# Altium footprint library self_pcblib v1.8.6.PcbLib: 164 footprints (part 2 of 11)
Each footprint in its own frame and in the unit in brackets; x right, y up, seen from the top. Pads: shape width x height; smd on the part's side, far side on the other; paste and mask are expansions set on the pad; w line width, h text height; cw(c..) or ccw(c..) is an arc to the next point about the centre after c.
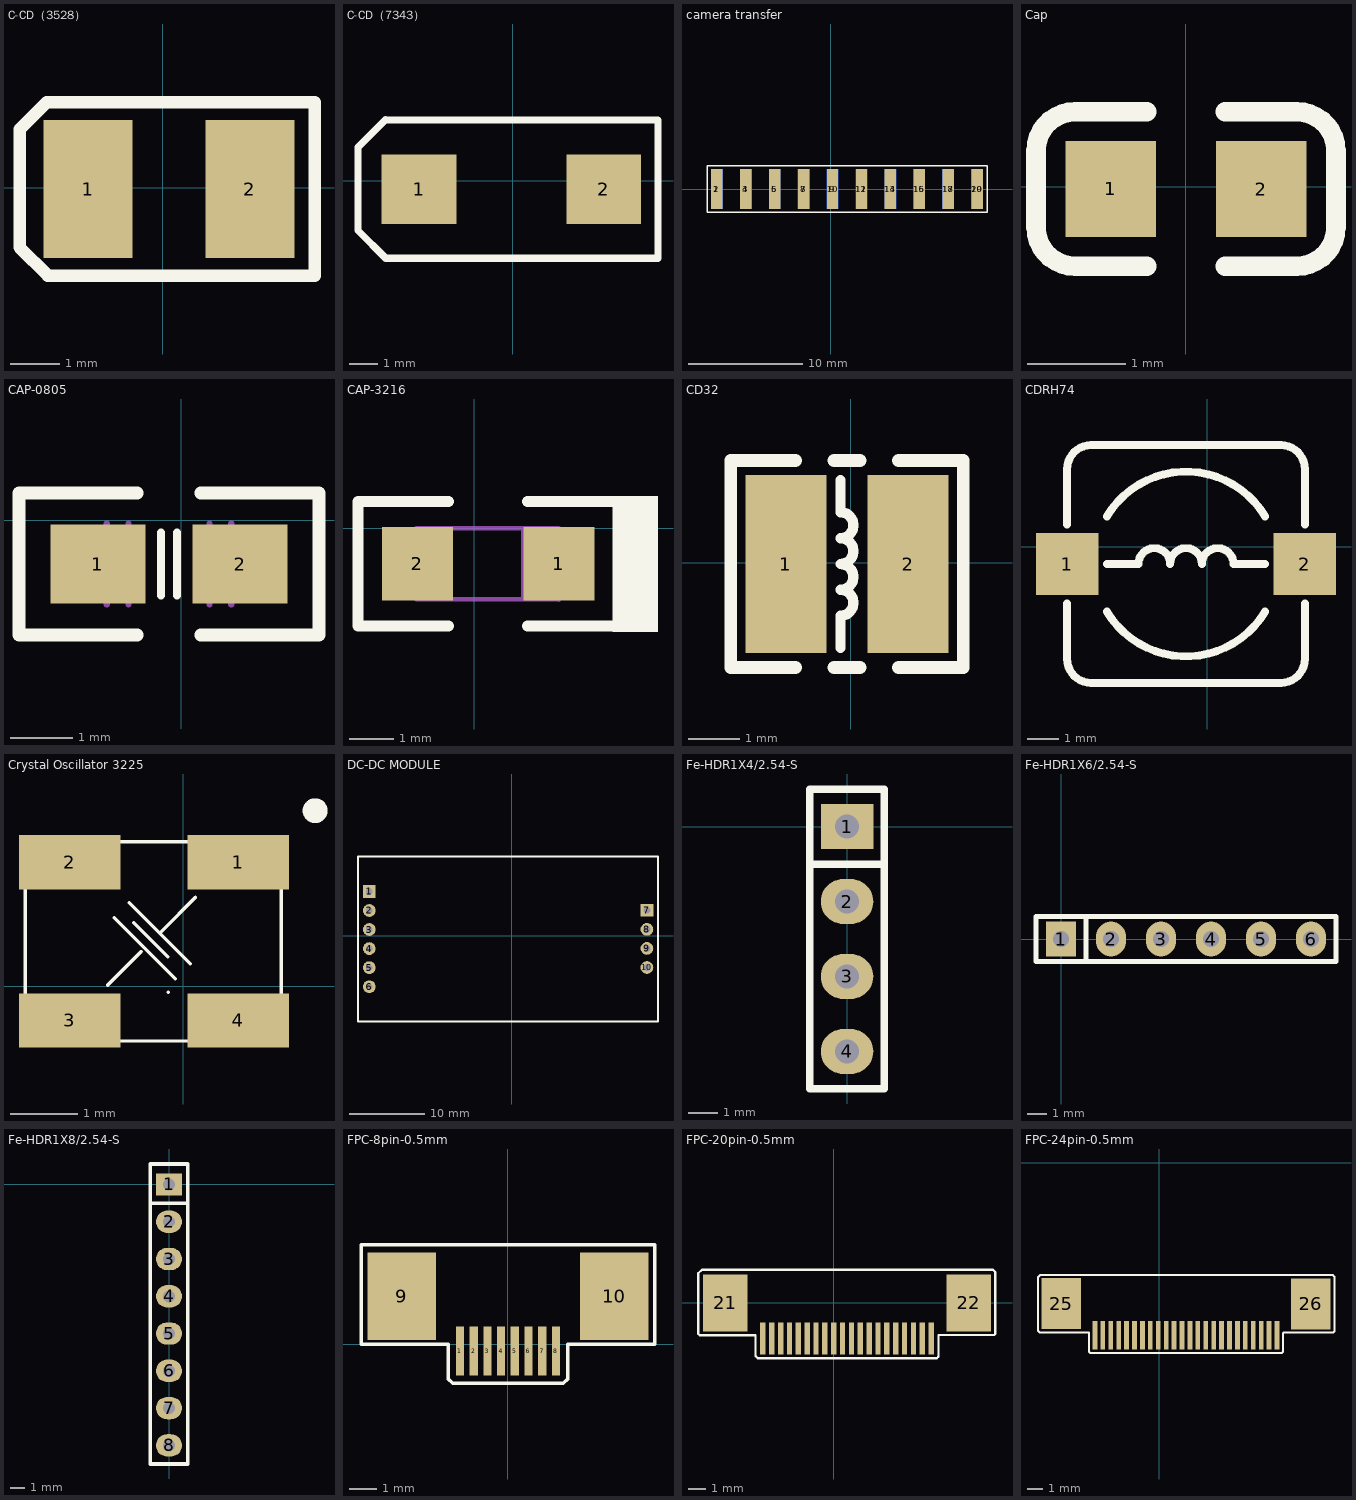
[diagram p1: the footprints below, top view; thin cyan lines are the x and y axes]

## C-CD（3528） [mil] "钽电容"
pads (2):
  rect 70.87x110 smd: 1(-59.5,-1) 2(69.5,-1)
Top Overlay:
  lines w10: -114,-47.5 -91.5,-70 121,-70 121,68 -92.5,68 -114,46.5 -114,-47.5
3D body "TAJ-B.STEP": height 74.8, standoff 0, extent -63.9,-56.11 73.9,54.12

## C-CD（7343） [mm] "钽电容"
pads (2):
  rect 2.6x2.4 smd: 1(-3.253,-0.298) 2(3.147,-0.298)
Top Overlay:
  lines w0.254: -4.42,-2.692 5.029,-2.692 5.029,2.083 ; -4.413,-2.693 -5.376,-1.73 -5.376,1.152 -4.42,2.108 5.029,2.101
3D body "TAJ-D.STEP": height 2.9, standoff 0, extent -3.701,-2.429 3.599,1.871
3D body: height 0.3, standoff 0, extent 3.257,-1.16 3.461,0.61
3D body: height 0.3, standoff 0, extent -3.538,-1.174 -3.442,0.515

## camera transfer [mm]
pads (20):
  rect 1x3.5 smd: 1(-10.008,0) 3(-7.468,0) 5(-4.928,0) 7(-2.388,0) 9(0.152,0) 11(2.692,0) 13(5.232,0) 15(7.772,0) 17(10.312,0) 19(12.852,0)
  rect 1x3.5 smd far side: 2(-10.008,0) 4(-7.468,0) 6(-4.928,0) 8(-2.388,0) 10(0.152,0) 12(2.692,0) 14(5.232,0) 16(7.772,0) 18(10.312,0) 20(12.852,0)
Top Overlay:
  lines w0.127: -10.871,-2.057 13.741,-2.057 13.741,2.057 -10.871,2.057 -10.871,-2.057

## Cap [mm]
pads (2):
  rect 0.93x0.98 smd: 1(-0.77,-0.025) 2(0.77,-0.025)
Top Overlay:
  lines w0.2: -0.4,-0.815 -1.135,-0.815 cw(c-1.135,-0.415) -1.535,-0.415 -1.535,0.365 cw(c-1.135,0.365) -1.135,0.765 -0.4,0.765 ; 0.4,-0.815 1.135,-0.815 ccw(c1.135,-0.415) 1.535,-0.415 1.535,0.365 ccw(c1.135,0.365) 1.135,0.765 0.4,0.765
3D body "User Library-0603 SMD Capacitor.STEP": height 0.3, standoff 0, extent -0.8,-0.425 0.8,0.375

## CAP-0805 [mm]
pads (2):
  rect 1.524x1.27 smd: 1(-1.343,-0.7) 2(0.943,-0.7)
Top Overlay:
  lines w0.127: -0.327,-1.208 -0.327,-0.192 ; -0.073,-1.208 -0.073,-0.192
  lines w0.203: -0.708,-1.843 -2.613,-1.843 -2.613,0.443 -0.708,0.443 ; 0.308,-1.843 2.213,-1.843 2.213,0.443 0.308,0.443
Mechanical 1:
  lines w0.1: -1.2,-1.35 -1.2,-0.05 ; -0.85,-1.35 -0.85,-0.05 ; 0.45,-1.35 0.45,-0.05 ; 0.8,-1.35 0.8,-0.05
3D body: height 0.5, standoff 0, extent -1.216,-1.335 -0.835,-0.065
3D body: height 0.5, standoff 0, extent -0.835,-1.335 0.435,-0.065
3D body: height 0.5, standoff 0, extent 0.435,-1.335 0.816,-0.065

## CAP-3216 [mm]
pads (2):
  rect 1.6x1.65 smd: 1(1.905,-0.791) 2(-1.27,-0.791)
Top Overlay:
  rectangle: 3.112,-2.327 4.128,0.733
  lines w0.254: -0.571,-2.188 -2.603,-2.188 -2.603,0.606 -0.571,0.606 ; 1.207,-2.188 3.112,-2.188 ; 1.207,0.606 3.112,0.606
Mechanical 1:
  lines w0.1: -1.321,-1.4 -1.473,-1.4 -1.473,-0.283 -1.295,-0.283 ; 1.105,-1.591 1.105,0.009 ; 1.905,-1.603 1.905,-1.426 ; 1.905,-1.591 -1.295,-1.591 -1.295,0.009 1.905,0.009 1.905,-1.426 ; 1.931,-0.283 2.108,-0.283 2.083,-0.308 2.083,-1.426 1.905,-1.426
3D body "3216-_A_钽电容.step": height 1.8, standoff 0, extent -1.446,-1.73 1.954,0.07

## CD32 [mm]
pads (2):
  rect 1.6x3.5 smd: 1(-1.276,-0.025) 2(1.124,-0.025)
Top Overlay:
  lines w0.203: -0.203,-1.676 -0.203,-1.041 ccw(c-0.203,-0.787) -0.203,-0.533 ccw(c-0.203,-0.279) -0.203,-0.025 ccw(c-0.203,0.229) -0.203,0.483 ccw(c-0.203,0.737) -0.203,0.991 -0.203,1.626
  lines w0.254: -1.092,-2.057 -2.362,-2.057 -2.362,2.007 -1.092,2.007 ; -0.33,-2.057 0.178,-2.057 ; -0.33,2.007 0.178,2.007 ; 0.94,-2.057 2.21,-2.057 2.21,2.007 0.94,2.007
3D body "CD32.STEP": height 2.15, standoff 0.05, extent -1.783,-1.525 1.631,1.475

## CDRH74 [mm] "电感"
pads (2):
  rect 2x2 smd: 1(-4.496,-0.559) 2(3.124,-0.559)
Top Overlay:
  lines w0.254: -4.496,-1.829 -4.496,-3.607 ccw(c-3.734,-3.607) -3.734,-4.369 2.362,-4.369 ccw(c2.362,-3.607) 3.124,-3.607 3.124,-1.829 ; -4.496,0.711 -4.496,2.489 cw(c-3.734,2.489) -3.734,3.251 2.362,3.251 cw(c2.362,2.489) 3.124,2.489 3.124,0.711 ; -3.226,-2.083 ccw(c-0.686,-0.559) 1.854,-2.083 ; -3.226,-0.559 -2.21,-0.559 cw(c-1.702,-0.559) -1.194,-0.559 cw(c-0.686,-0.559) -0.178,-0.559 cw(c0.33,-0.559) 0.838,-0.559 1.854,-0.559 ; -3.226,0.965 cw(c-0.686,-0.559) 1.854,0.965
3D body "CDRH74.STEP": height 4.5, standoff 0, extent -4.336,-4.242 2.964,3.058

## Crystal Oscillator 3225 [mm]
pads (4):
  rect 1.5x0.8 smd: 1(0.813,1.829) 2(-1.676,1.829) 3(-1.676,-0.508) 4(0.813,-0.508)
Top Overlay:
  circle w0.254: c1.95,2.591 r0.057
  lines w0.051: -1.018,1.01 -0.118,0.11 ; -0.798,1.23 0.102,0.33 ; -0.729,0.932 -0.229,0.432 ; -0.618,0.51 -1.118,0.01 ; 0.182,1.31 -0.318,0.81 ; -1.118,0.01 -1.118,0.01 ; -0.318,0.81 -0.318,0.81 ; -2.334,-0.813 1.448,-0.813 1.448,2.134 -2.334,2.134 -2.334,-0.813 ; -0.218,-0.09 -0.218,-0.09
3D body "User Library-3225-1.STEP": height 0.61, standoff 0, extent -2.057,-0.59 1.143,1.91

## DC-DC MODULE [mm]
pads (10):
  rect 1.7x1.7 hole 0.9: 1(-19,5.91) 7(18.008,3.395)
  round 1.7 hole 0.9: 2(-19,3.37) 3(-19,0.83) 4(-19,-1.71) 5(-19,-4.25) 6(-19,-6.79) 8(18.008,0.855) 9(18.008,-1.685) 10(18.008,-4.225)
Top Overlay:
  lines w0.254: -20.51,-11.431 -20.51,10.569 19.49,10.569 19.49,-11.431 -20.51,-11.431
3D body "HDR2.54-1P.STEP": height 8.5, standoff -3, extent -20.27,-8.06 -17.73,-5.52
3D body "HDR2.54-1P.STEP": height 8.5, standoff -3, extent -20.27,-5.52 -17.73,-2.98
3D body "HDR2.54-1P.STEP": height 8.5, standoff -3, extent -20.27,-2.98 -17.73,-0.44
3D body "HDR2.54-1P.STEP": height 8.5, standoff -3, extent -20.27,-0.44 -17.73,2.1
3D body "HDR2.54-1P.STEP": height 8.5, standoff -3, extent -20.27,2.1 -17.73,4.64
3D body "HDR2.54-1P.STEP": height 8.5, standoff -3, extent -20.27,4.64 -17.73,7.18
3D body "HDR2.54-1P.STEP": height 8.5, standoff -3, extent 16.738,2.125 19.278,4.665
3D body "HDR2.54-1P.STEP": height 8.5, standoff -3, extent 16.738,-0.415 19.278,2.125
3D body "HDR2.54-1P.STEP": height 8.5, standoff -3, extent 16.738,-2.955 19.278,-0.415
3D body "HDR2.54-1P.STEP": height 8.5, standoff -3, extent 16.738,-5.495 19.278,-2.955

## Fe-HDR1X4/2.54-S [mil]
pads (4):
  rect 70x60 hole 32: 1(0,0)
  oval 70x60 hole 32: 2(0,-100) 3(0,-200) 4(0,-300)
Top Overlay:
  lines w10: -50,-50 50,-50 ; -50,-350 -50,50 50,50 50,-350 -50,-350
3D body "Female-Header-2.54-Single-4.stp": height 334.65, standoff -125.98, extent -44.21,-354.92 54.22,54.92

## Fe-HDR1X6/2.54-S [mil]
pads (6):
  rect 60x70 hole 32: 1(0,0)
  oval 60x70 hole 32: 2(100,0) 3(200,0) 4(300,0) 5(400,0) 6(500,0)
Top Overlay:
  lines w10: 50,-45 50,45 ; -50,-45 550,-45 550,45 -50,45 -50,-45
3D body "Female-Header-2.54-Single-6.stp": height 108.98, standoff -351.65, extent -54.84,-49.21 555,49.21

## Fe-HDR1X8/2.54-S [mil]
pads (8):
  rect 70x60 hole 32: 1(0,0)
  oval 70x60 hole 32: 2(0,-100) 3(0,-200) 4(0,-300) 5(0,-400) 6(0,-500) 7(0,-600) 8(0,-700)
Top Overlay:
  lines w10: -50,-50 50,-50 ; -50,-750 50,-750 50,55 -50,55 -50,-750
3D body "Female-Header-2.54-Single-8.stp": height 125.98, standoff -334.65, extent -49.21,-754.92 49.22,54.92

## FPC-8pin-0.5mm [mm]
pads (10):
  rect 0.3x1.8 smd: 1(-1.739,-0.247) 2(-1.239,-0.247) 3(-0.739,-0.247) 4(-0.239,-0.247) 5(0.261,-0.247) 6(0.761,-0.247) 7(1.261,-0.247) 8(1.761,-0.247)
  rect 2.5x3.2 smd: 9(-3.861,1.753) 10(3.886,1.753)
Top Overlay:
  lines w0.127: -5.334,0 -5.334,3.632 5.359,3.632 5.359,0 2.184,0 2.184,-1.27 2.032,-1.422 -2.007,-1.422 -2.159,-1.27 -2.159,0 -5.334,0
3D body "1734839-8.stp": height 2.02, standoff -0.03, extent -4.715,-0.741 4.715,4.369

## FPC-20pin-0.5mm [mm]
pads (22):
  rect 0.3x1.8 smd: 1(-4,-2) 2(-3.5,-2) 3(-3,-2) 4(-2.5,-2) 5(-2,-2) 6(-1.5,-2) 7(-1,-2) 8(-0.5,-2) 9(0,-2) 10(0.5,-2) 11(1,-2) 12(1.5,-2) 13(2,-2) 14(2.5,-2) 15(3,-2) 16(3.5,-2) 17(4,-2) 18(4.5,-2) 19(5,-2) 20(5.5,-2)
  rect 2.5x3.2 smd: 21(-6.121,0) 22(7.62,0)
Top Overlay:
  lines w0.127: -7.645,-1.753 -7.569,-1.829 -4.42,-1.829 -4.42,-2.997 -4.293,-3.124 5.817,-3.124 5.918,-3.023 5.918,-1.803 9.068,-1.803 9.119,-1.753 9.119,1.753 8.992,1.88 -7.442,1.88 -7.645,1.676 -7.645,-1.753
3D body "2-1734839-0.stp": height 2.02, standoff -0.03, extent -6.978,-2.54 8.452,2.57

## FPC-24pin-0.5mm [mm]
pads (26):
  rect 0.3x1.8 smd: 1(-4.076,-10.89) 2(-3.576,-10.89) 3(-3.076,-10.89) 4(-2.576,-10.89) 5(-2.076,-10.89) 6(-1.576,-10.89) 7(-1.076,-10.89) 8(-0.576,-10.89) 9(-0.076,-10.89) 10(0.424,-10.89) 11(0.924,-10.89) 12(1.424,-10.89) 13(1.924,-10.89) 14(2.424,-10.89) 15(2.924,-10.89) 16(3.424,-10.89) 17(3.924,-10.89) 18(4.424,-10.89) 19(4.924,-10.89) 20(5.424,-10.89) 21(5.924,-10.89) 22(6.424,-10.89) 23(6.924,-10.89) 24(7.424,-10.89)
  rect 2.5x3.2 smd: 25(-6.198,-8.89) 26(9.55,-8.915)
Top Overlay:
  lines w0.127: -7.671,-10.617 -7.671,-7.239 -7.518,-7.087 10.947,-7.087 11.049,-7.188 11.049,-10.643 10.973,-10.719 7.849,-10.719 7.798,-10.77 7.798,-11.938 7.722,-12.014 -4.369,-12.014 -4.445,-11.938 -4.445,-10.719 -7.569,-10.719 -7.671,-10.617
3D body "2-1734592-4.stp": height 2.02, standoff -0.03, extent -7.039,-11.252 10.391,-6.142